# Altium footprint library HW_HOLLAND_NCDM_MONITOR_R1.PcbLib: 472 footprints (part 6 of 30)
Each footprint in its own frame and in the unit in brackets; x right, y up, seen from the top. Pads: shape width x height; smd on the part's side, far side on the other; paste and mask are expansions set on the pad; w line width, h text height; cw(c..) or ccw(c..) is an arc to the next point about the centre after c.
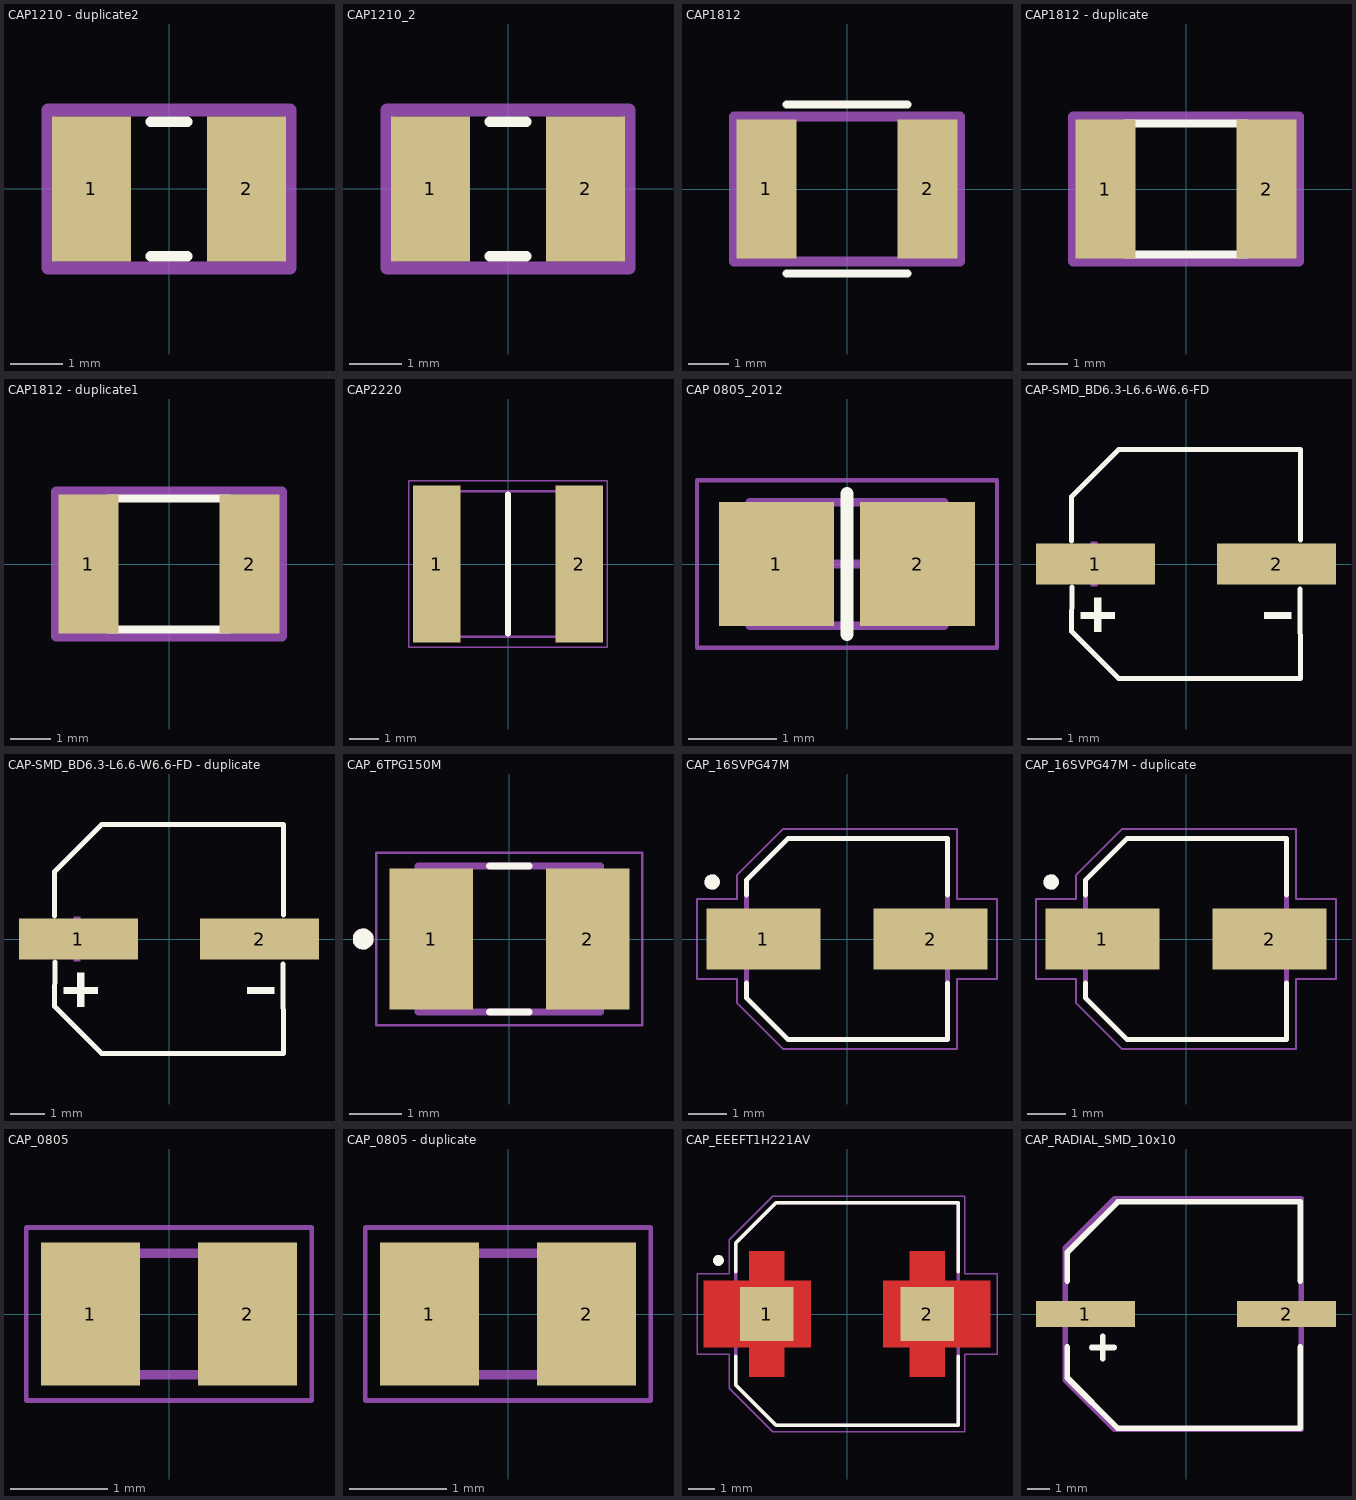
[diagram p5: the footprints below, top view; thin cyan lines are the x and y axes]

## CAP1210 - duplicate2 [mm] "CAPACITOR 1210"
height 1.8
pads (2):
  rect 1.5x2.75 smd: 1(-1.475,0) 2(1.475,0)
Top Overlay:
  lines w0.2: -0.35,-1.275 0.35,-1.275 ; -0.35,1.275 0.35,1.275
Top Designator:
  lines w0.254: -2.3,-1.5 -2.3,1.5 2.3,1.5 2.3,-1.5 -2.3,-1.5
  text "'.Designator'" at -6.475,-0.476 h1.14
3D body "CAP1210.step": height 1.8, standoff 0, extent -1.6,-1.25 1.6,1.25

## CAP1210_2 [mm]
pads (2):
  rect 1.5x2.75 smd: 1(-1.475,0) 2(1.475,0)
Top Overlay:
  lines w0.2: -0.35,-1.275 0.35,-1.275 ; -0.35,1.275 0.35,1.275
Top Designator:
  lines w0.254: -2.3,-1.5 2.3,-1.5 2.3,1.5 -2.3,1.5 -2.3,-1.5
  text "'.Designator'" at -6.475,-0.476 h1.14
3D body "CAP1210.step": height 1.8, standoff 0, extent -1.6,-1.25 1.6,1.25

## CAP1812 [mm]
pads (2):
  rect 1.5x3.45 smd: 1(-2,0) 2(2,0)
Top Overlay:
  lines w0.2: -1.5,-2.1 1.5,-2.1 ; -1.5,2.1 1.5,2.1
Top Designator:
  lines w0.254: -2.8,-1.8 2.8,-1.8 2.8,1.8 -2.8,1.8 -2.8,-1.8
  text "'.Designator'" at -7.194,-0.529 h1.27
3D body "CAP1812.step": height 1.4, standoff 0, extent -2.25,-1.6 2.25,1.6

## CAP1812 - duplicate [mm]
pads (2):
  rect 1.5x3.45 smd: 1(-2,0) 2(2,0)
Top Overlay:
  lines w0.2: -1.5,-1.625 1.5,-1.625 ; -1.5,1.625 1.5,1.625
Top Designator:
  lines w0.254: -2.8,-1.8 2.8,-1.8 2.8,1.8 -2.8,1.8 -2.8,-1.8
  text "'.Designator'" at -7.194,-0.529 h1.27
3D body "CAP1812.step": height 1.4, standoff 0, extent -2.25,-1.6 2.25,1.6

## CAP1812 - duplicate1 [mm]
height 0.52
pads (2):
  rect 1.5x3.45 smd: 1(-2,0) 2(2,0)
Top Overlay:
  lines w0.2: -1.5,-1.625 1.5,-1.625 ; -1.5,1.625 1.5,1.625
Top Designator:
  lines w0.254: -2.8,-1.8 2.8,-1.8 2.8,1.8 -2.8,1.8 -2.8,-1.8
  text "'.Designator'" at -7.194,-0.529 h1.27
3D body "CAP1812.step": height 1.4, standoff 0, extent -2.25,-1.6 2.25,1.6

## CAP2220 [mm]
pads (2):
  rect 1.62x5.41 smd: 1(-2.45,0) 2(2.45,0)
Top Overlay:
  lines w0.2: 0,-2.4 0,2.4
Mechanical 13:
  lines w0.1: -2.85,-2.5 -2.85,2.5 2.85,2.5 2.85,-2.5 -2.85,-2.5
Mechanical 15:
  lines w0.05: -3.41,-2.86 -3.41,2.86 3.41,2.86 3.41,-2.86 -3.41,-2.86
3D body "KTS500B156M55N0T00.stp": height 2.8, standoff 0, extent -2.85,-2.5 2.85,2.5

## CAP 0805_2012 [mm] "Chip Capacitor, 2-Leads, Body 2.00x1.20mm, IPC Medium Density"
height 1.15
pads (2):
  rect 1.3x1.4 smd: 1(-0.8,0) 2(0.8,0)
Top Overlay:
  lines w0.15: 0,-0.8 0,0.8
Mechanical 13:
  lines w0.1: -1.1,-0.7 -1.1,0.7 1.1,0.7 1.1,-0.7 -1.1,-0.7
Mechanical 15:
  lines w0.05: -1.7,-0.95 -1.7,0.95 1.7,0.95 1.7,-0.95 -1.7,-0.95
  lines w0.1: -0.5,0 0.5,0 ; 0,-0.5 0,0.5
3D body "0805 cap.STEP": height 1.26, standoff -0.02, extent -1,-0.637 1,0.637

## CAP-SMD_BD6.3-L6.6-W6.6-FD [mm]
pads (2):
  rect 3.5x1.2 smd: 1(-2.67,0) 2(2.67,0)
Top Overlay:
  region: 3.102,-1.419 3.102,-1.617 2.31,-1.617 2.31,-1.419
  region: -3.102,-1.419 -3.102,-1.617 -2.1,-1.617 -2.1,-1.419
  region: -2.7,-2.001 -2.502,-2.001 -2.502,-0.999 -2.7,-0.999
  lines w0.152: -3.376,0.686 -3.376,1.98 -1.98,3.376 3.376,3.376 3.369,0.708 ; -3.362,-0.686 -3.376,-1.981 -1.981,-3.376 3.376,-3.376 3.356,-0.739
Mechanical 15:
  region: 3.102,0.099 3.102,-0.099 2.31,-0.099 2.31,0.099
  region: -3.102,0.099 -3.102,-0.099 -2.31,-0.099 -2.31,0.099
  region: -2.81,0.66 -2.81,-0.66 -2.612,-0.66 -2.612,0.66
3D body "User Library-cap-17.STEP": height 5.36, standoff 0.06, extent -3.604,-3.354 3.596,3.246

## CAP-SMD_BD6.3-L6.6-W6.6-FD - duplicate [mm]
pads (2):
  rect 3.5x1.2 smd: 1(-2.67,0) 2(2.67,0)
Top Overlay:
  region: 3.102,-1.419 3.102,-1.617 2.31,-1.617 2.31,-1.419
  region: -3.102,-1.419 -3.102,-1.617 -2.1,-1.617 -2.1,-1.419
  region: -2.7,-2.001 -2.502,-2.001 -2.502,-0.999 -2.7,-0.999
  lines w0.152: -3.376,0.686 -3.376,1.98 -1.98,3.376 3.376,3.376 3.369,0.708 ; -3.362,-0.686 -3.376,-1.981 -1.981,-3.376 3.376,-3.376 3.356,-0.739
Mechanical 15:
  region: 3.102,0.099 3.102,-0.099 2.31,-0.099 2.31,0.099
  region: -3.102,0.099 -3.102,-0.099 -2.31,-0.099 -2.31,0.099
  region: -2.81,0.66 -2.81,-0.66 -2.612,-0.66 -2.612,0.66
3D body "User Library-cap-17.STEP": height 5.36, standoff 0.06, extent -3.604,-3.354 3.596,3.246

## CAP_6TPG150M [mm]
pads (2):
  rect 1.6x2.7 smd: 1(-1.5,0) 2(1.5,0)
Top Overlay:
  circle w0.2: c-2.8,0 r0.1
  lines w0.127: -0.38,-1.4 0.38,-1.4 ; -0.38,1.4 0.38,1.4
Mechanical 13:
  circle w0.2: c-2.8,0 r0.1
  lines w0.127: -1.75,-1.4 1.75,-1.4 1.75,1.4 -1.75,1.4 -1.75,-1.4
Mechanical 15:
  lines w0.05: -2.55,-1.65 2.55,-1.65 2.55,1.65 -2.55,1.65 -2.55,-1.65
3D body "6TPG150M.STEP": height 1.57, standoff -0.15, extent -1.811,-1.4 1.782,1.4

## CAP_16SVPG47M [mm]
pads (2):
  rect 3x1.6 smd: 1(-2.2,0) 2(2.2,0)
Top Overlay:
  circle w0.2: c-3.55,1.5 r0.1
  lines w0.127: -2.65,-1.15 -2.65,-1.55 -1.55,-2.65 2.65,-2.65 2.65,-1.15 ; -2.65,1.15 -2.65,1.55 -1.55,2.65 2.65,2.65 2.65,1.15
Mechanical 13:
  circle w0.2: c-3.55,1.5 r0.1
  lines w0.127: -2.65,-1.55 -1.55,-2.65 2.65,-2.65 2.65,2.65 -1.55,2.65 -2.65,1.55 -2.65,-1.55
Mechanical 15:
  lines w0.05: -3.95,-1.05 -2.9,-1.05 -2.9,-1.675 -1.675,-2.9 2.9,-2.9 2.9,-1.05 3.95,-1.05 3.95,1.05 2.9,1.05 2.9,2.9 -1.675,2.9 -2.9,1.675 -2.9,1.05 -3.95,1.05 -3.95,-1.05
3D body "16SVPG47M--3DModel-STEP-1.STEP": height 4.4, standoff 0, extent -3,-2.65 3,2.65

## CAP_16SVPG47M - duplicate [mm]
pads (2):
  rect 3x1.6 smd: 1(-2.2,0) 2(2.2,0)
Top Overlay:
  circle w0.2: c-3.55,1.5 r0.1
  lines w0.127: -2.65,-1.15 -2.65,-1.55 -1.55,-2.65 2.65,-2.65 2.65,-1.15 ; -2.65,1.15 -2.65,1.55 -1.55,2.65 2.65,2.65 2.65,1.15
Mechanical 13:
  circle w0.2: c-3.55,1.5 r0.1
  lines w0.127: -2.65,-1.55 -1.55,-2.65 2.65,-2.65 2.65,2.65 -1.55,2.65 -2.65,1.55 -2.65,-1.55
Mechanical 15:
  lines w0.05: -3.95,-1.05 -2.9,-1.05 -2.9,-1.675 -1.675,-2.9 2.9,-2.9 2.9,-1.05 3.95,-1.05 3.95,1.05 2.9,1.05 2.9,2.9 -1.675,2.9 -2.9,1.675 -2.9,1.05 -3.95,1.05 -3.95,-1.05
3D body "16SVPG47M--3DModel-STEP-1.STEP": height 4.4, standoff 0, extent -3,-2.65 3,2.65

## CAP_0805 [mm]
pads (2):
  rect 1.02x1.47 smd: 1(-0.81,0) 2(0.81,0)
Mechanical 13:
  lines w0.1: -1.005,-0.625 1.005,-0.625 1.005,0.625 -1.005,0.625 -1.005,-0.625
Mechanical 15:
  lines w0.05: -1.47,-0.89 1.47,-0.89 1.47,0.89 -1.47,0.89 -1.47,-0.89
3D body "08055A180JAT2A.stp": height 0.94, standoff 0, extent -1.005,-0.625 1.005,0.625

## CAP_0805 - duplicate [mm]
pads (2):
  rect 1.02x1.47 smd: 1(-0.81,0) 2(0.81,0)
Mechanical 13:
  lines w0.1: -1.005,-0.625 1.005,-0.625 1.005,0.625 -1.005,0.625 -1.005,-0.625
Mechanical 15:
  lines w0.05: -1.47,-0.89 1.47,-0.89 1.47,0.89 -1.47,0.89 -1.47,-0.89
3D body "08055A180JAT2A.stp": height 0.94, standoff 0, extent -1.005,-0.625 1.005,0.625

## CAP_EEEFT1H221AV [mm]
pads (2):
  rect 2x2 smd paste-2 mask+0: 1(-3,0) 2(3,0)
Top Layer:
  region: -2.35,1.25 -1.35,1.25 -1.35,-1.25 -2.35,-1.25 -2.35,-2.35 -3.65,-2.35 -3.65,-1.25 -5.35,-1.25 -5.35,1.25 -3.65,1.25 -3.65,2.35 -2.35,2.35
  region: 3.65,1.25 5.35,1.25 5.35,-1.25 3.65,-1.25 3.65,-2.35 2.35,-2.35 2.35,-1.25 1.35,-1.25 1.35,1.25 2.35,1.25 2.35,2.35 3.65,2.35
Top Overlay:
  circle w0.2: c-4.8,2 r0.1
  lines w0.127: -4.15,-1.57 -4.15,-2.65 -2.65,-4.15 4.15,-4.15 4.15,-1.57 ; -4.15,1.57 -4.15,2.65 -2.65,4.15 4.15,4.15 4.15,1.57
Top Paste:
  region: -2.35,1.25 -1.35,1.25 -1.35,-1.25 -2.35,-1.25 -2.35,-2.35 -3.65,-2.35 -3.65,-1.25 -5.35,-1.25 -5.35,1.25 -3.65,1.25 -3.65,2.35 -2.35,2.35
  region: 3.65,1.25 5.35,1.25 5.35,-1.25 3.65,-1.25 3.65,-2.35 2.35,-2.35 2.35,-1.25 1.35,-1.25 1.35,1.25 2.35,1.25 2.35,2.35 3.65,2.35
Top Solder:
  region: -2.25,1.35 -1.25,1.35 -1.25,-1.35 -2.25,-1.35 -2.25,-2.45 -3.75,-2.45 -3.75,-1.35 -5.45,-1.35 -5.45,1.35 -3.75,1.35 -3.75,2.45 -2.25,2.45
  region: 3.75,1.35 5.45,1.35 5.45,-1.35 3.75,-1.35 3.75,-2.45 2.25,-2.45 2.25,-1.35 1.25,-1.35 1.25,1.35 2.25,1.35 2.25,2.45 3.75,2.45
Mechanical 13:
  circle w0.2: c-4.8,2 r0.1
  lines w0.127: -4.15,-2.65 -4.15,2.65 -2.65,4.15 4.15,4.15 4.15,-4.15 -2.65,-4.15 -4.15,-2.65
Mechanical 15:
  lines w0.05: -5.6,-1.5 -4.4,-1.5 -4.4,-2.775 -2.775,-4.4 4.4,-4.4 4.4,-1.5 5.6,-1.5 5.6,1.5 4.4,1.5 4.4,4.4 -2.775,4.4 -4.4,2.775 -4.4,1.5 -5.6,1.5 -5.6,-1.5
3D body "step_temp.STEP": height 10.5, standoff 0, extent -4.85,-4.15 4.85,4.15

## CAP_RADIAL_SMD_10x10 [mm]
height 0.52
pads (2):
  rect 4.5x1.2 smd: 1(-4.572,0) 2(4.572,0)
Top Overlay:
  lines w0.254: -5.4,-1.5 -5.4,-2.9 -3.1,-5.2 5.2,-5.2 5.2,-1.5 ; -5.4,1.5 -5.4,2.8 -3.1,5.1 5.2,5.1 5.2,1.5 ; -4.289,-1.524 -3.273,-1.524 ; -3.781,-2.032 -3.781,-1.016
Top Designator:
  lines w0.254: -5.5,-3 -3.25,-5.25 5.25,-5.25 5.25,1.5 5.25,5.25 -3.25,5.25 -5.5,3 -5.5,-3
  text ".Designator" at -12.696,-0.846 h2.54
3D body "SW3dPS-capacitor size G.STEP": height 10.21, standoff -0.01, extent -5.8,-5.15 5.8,5.15